# Altium schematic symbol library Analog Devices Data Converters Analog-to-Digital Converters.SchLib: 2404 symbols (part 15 of 213)
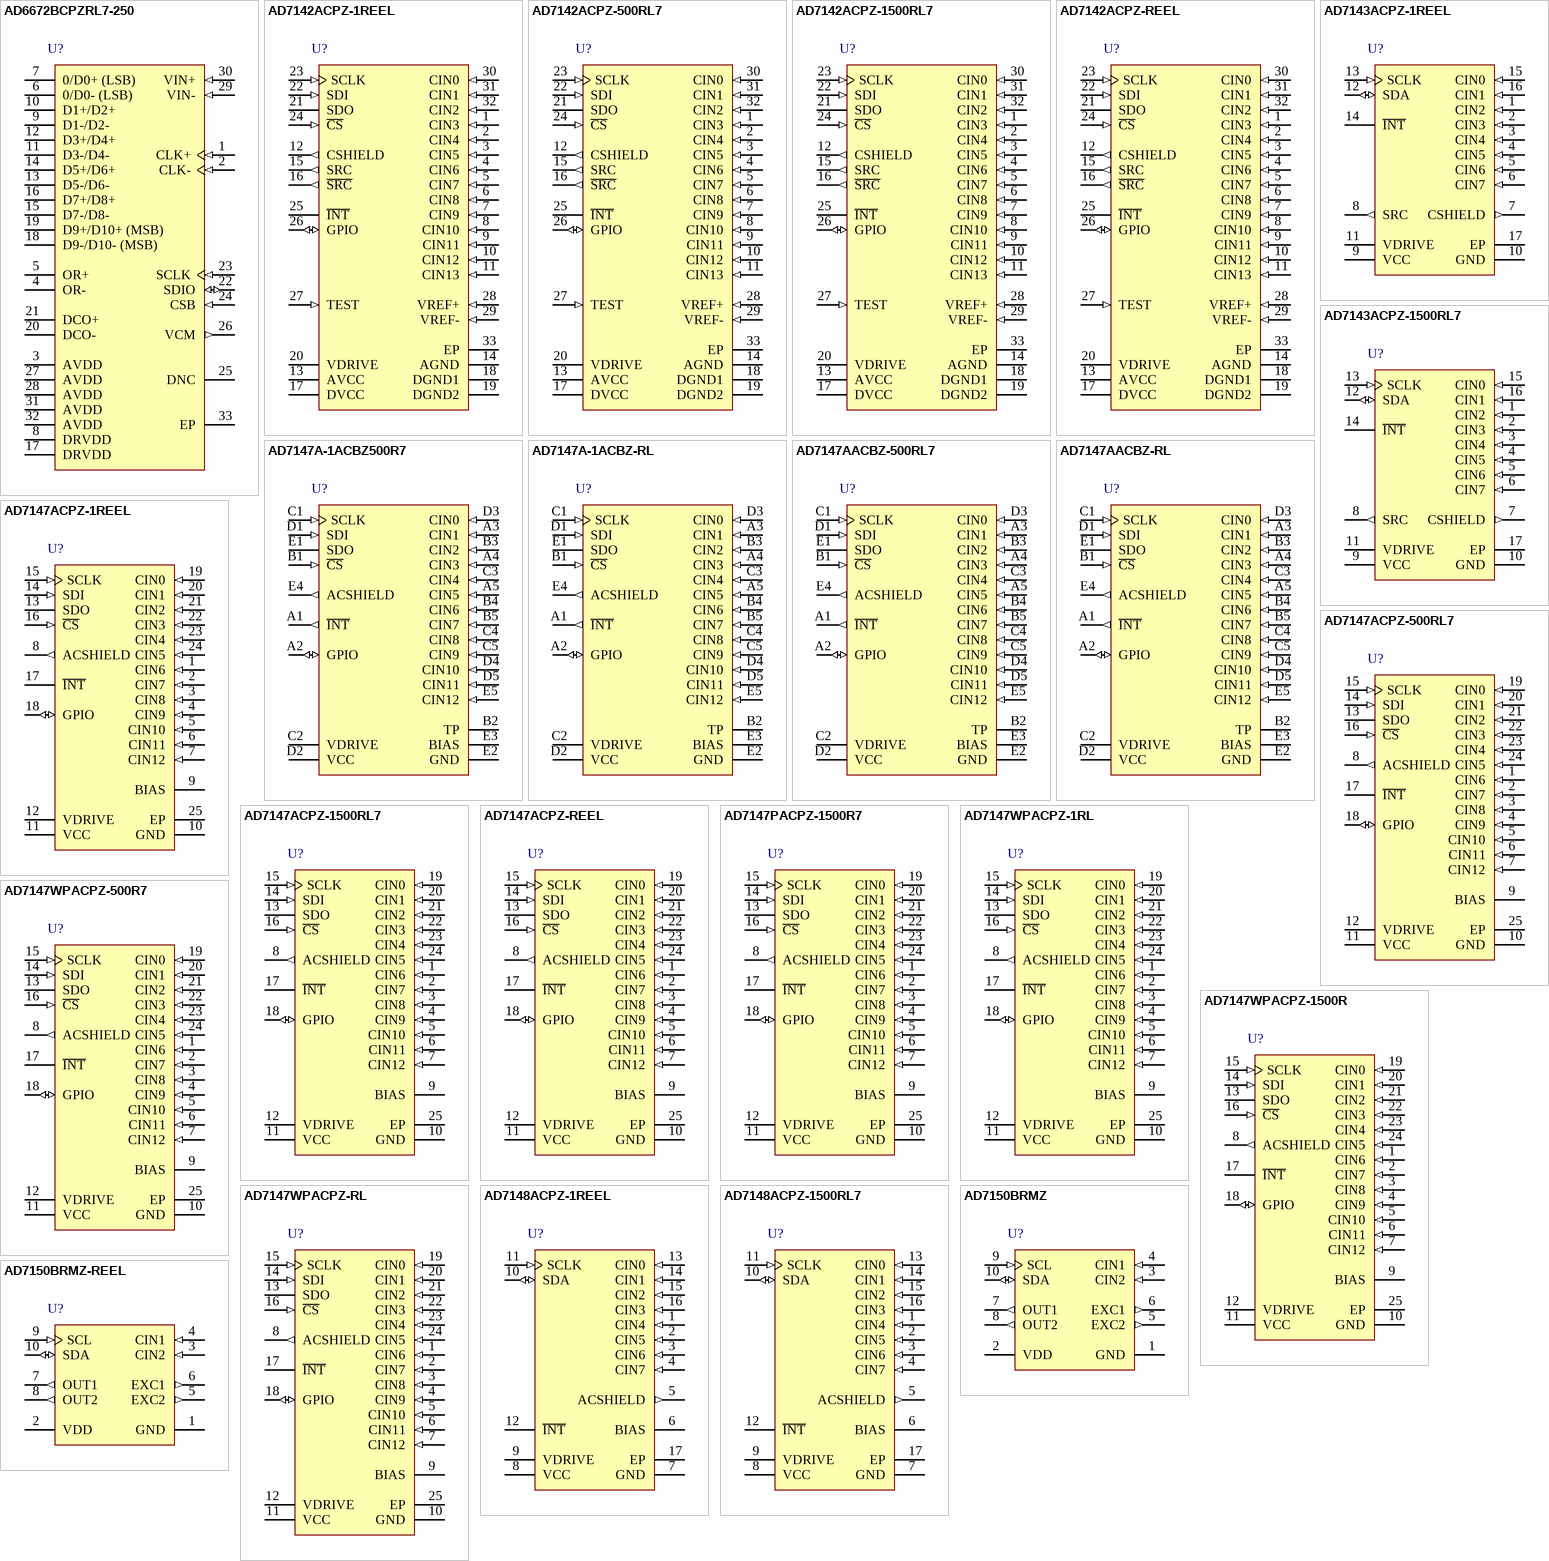
[diagram p170: symbols AD6672BCPZRL7-250 to AD7150BRMZ-REEL]

## AD7143ACPZ-1REEL
designator U?
Programmable Controller for Capacitance Touch Sensors with I2C/Ser 2-Wire, Serial Interface, 43.5SPS, -40 to +85 degC, CP-16-13, Pb-Free, Reel; Generic Part Number: AD7143; Manufacturer: Analog Devices; PartNumber: AD7143ACPZ-1REEL; Resolution (Bits): 16; Channels: 8; Throughput Rate (SPS): 43.5; DatasheetVersion: Rev.0; PackageVersion: 031006-A; PackageReference: CP-16-13; PackageDescription: 16-Lead Lead Frame Chip Scale Package [LFCSP_VQ] 4 x 4 mm Body, Very Thin Quad; Supplier 1: Digi-Key; Supplier Part Number 1: AD7143ACPZ-1REEL-ND; Supplier 2: Mouser; Supplier Part Number 2: 584-AD7143ACPZ-1R; Interface: I2C/Ser 2-Wire, Ser; RoHS: Y; Packing: Reel; Mounting Technology: Surface Mount; Code_JEDEC: MO-220-VGGC; ComponentLink1Description: Manufacturer URL; ComponentLink1URL: http://www.analog.com/en/index.html; ComponentLink2Description: Datasheet; ComponentLink2URL: http://www.analog.com/static/imported-files/data_sheets/AD7143.pdf; ComponentLink3Description: Package Specification; ComponentLink3URL: http://www.analog.com/static/imported-files/packages/PKG_PDF/LFCSP(CP)/CP-16/CP_16_13.pdf; ComponentLink4Description: Product URL; ComponentLink4URL: http://www.analog.com/en/analog-to-digital-converters/ad-converters/ad7143/products/product.html
footprint CP-16-13_N (QFN, 16-Leads, Body 4x4mm, Pitch 0.65mm, Thermal Pad 2.5x2.5mm, IPC Medium Density)
footprint CP-16-13_L (QFN, 16-Leads, Body 4x4mm, Pitch 0.65mm, Thermal Pad 2.5x2.5mm, IPC High Density)
footprint CP-16-13_M (QFN, 16-Leads, Body 4x4mm, Pitch 0.65mm, Thermal Pad 2.5x2.5mm, IPC Low Density)
pins: 1 CIN2 (in) "Capacitance Sensor Input.", 2 CIN3 (in) "Capacitance Sensor Input.", 3 CIN4 (in) "Capacitance Sensor Input.", 4 CIN5 (in) "Capacitance Sensor Input.", 5 CIN6 (in) "Capacitance Sensor Input.", 6 CIN7 (in) "Capacitance Sensor Input.", 7 CSHIELD (out) "CDC Shield Potential Output. Requires 10 nF capacitor to ground.", 8 SRC (out) "CDC Excitation Source Output.", 9 VCC (power) "CDC Supply Voltage.", 10 GND (power) "Ground Reference Point for All CDC Circuitry. Tie to ground plane.", 11 VDRIVE (power) "I2C Serial Interface Operating Voltage", 12 SDA (io) "I2C Serial Data Input/Output. SDA requires pull-up resistor", 13 SCLK (in) "Clock Input for Serial Interface. SCLK requires pull-up resistor.", 14 ~{INT} (oc) "General-Purpose Open-Drain Interrupt Output. Programmable polarity; requires pull-up resistor.", 15 CIN0 (in) "Capacitance Sensor Input.", 16 CIN1 (in) "Capacitance Sensor Input.", 17 EP (power) "Exposed pad"

## AD7143ACPZ-1500RL7
designator U?
Programmable Controller for Capacitance Touch Sensors with I2C/Ser 2-Wire, Serial Interface, 43.5SPS, -40 to +85 degC, CP-16-13, Pb-Free, Reel; Generic Part Number: AD7143; Manufacturer: Analog Devices; PartNumber: AD7143ACPZ-1500RL7; Resolution (Bits): 16; Channels: 8; Throughput Rate (SPS): 43.5; DatasheetVersion: Rev.0; PackageVersion: 031006-A; PackageReference: CP-16-13; PackageDescription: 16-Lead Lead Frame Chip Scale Package [LFCSP_VQ] 4 x 4 mm Body, Very Thin Quad; Supplier 1: Digi-Key; Supplier Part Number 1: AD7143ACPZ-1500RL7TR-ND; Supplier 2: Digi-Key; Supplier Part Number 2: AD7143ACPZ-1500RL7CT-ND; Supplier 3: Digi-Key; Supplier Part Number 3: AD7143ACPZ-1500RL7DKR-ND; Supplier 4: Mouser; Supplier Part Number 4: 584-AD7143ACPZ1500R7; Interface: I2C/Ser 2-Wire, Ser; RoHS: Y; Packing: Reel; Mounting Technology: Surface Mount; Code_JEDEC: MO-220-VGGC; ComponentLink1Description: Manufacturer URL; ComponentLink1URL: http://www.analog.com/en/index.html; ComponentLink2Description: Datasheet; ComponentLink2URL: http://www.analog.com/static/imported-files/data_sheets/AD7143.pdf; ComponentLink3Description: Package Specification; ComponentLink3URL: http://www.analog.com/static/imported-files/packages/PKG_PDF/LFCSP(CP)/CP-16/CP_16_13.pdf; ComponentLink4Description: Product URL; ComponentLink4URL: http://www.analog.com/en/analog-to-digital-converters/ad-converters/ad7143/products/product.html
footprint CP-16-13_N (QFN, 16-Leads, Body 4x4mm, Pitch 0.65mm, Thermal Pad 2.5x2.5mm, IPC Medium Density)
footprint CP-16-13_L (QFN, 16-Leads, Body 4x4mm, Pitch 0.65mm, Thermal Pad 2.5x2.5mm, IPC High Density)
footprint CP-16-13_M (QFN, 16-Leads, Body 4x4mm, Pitch 0.65mm, Thermal Pad 2.5x2.5mm, IPC Low Density)
pins: 1 CIN2 (in) "Capacitance Sensor Input.", 2 CIN3 (in) "Capacitance Sensor Input.", 3 CIN4 (in) "Capacitance Sensor Input.", 4 CIN5 (in) "Capacitance Sensor Input.", 5 CIN6 (in) "Capacitance Sensor Input.", 6 CIN7 (in) "Capacitance Sensor Input.", 7 CSHIELD (out) "CDC Shield Potential Output. Requires 10 nF capacitor to ground.", 8 SRC (out) "CDC Excitation Source Output.", 9 VCC (power) "CDC Supply Voltage.", 10 GND (power) "Ground Reference Point for All CDC Circuitry. Tie to ground plane.", 11 VDRIVE (power) "I2C Serial Interface Operating Voltage", 12 SDA (io) "I2C Serial Data Input/Output. SDA requires pull-up resistor", 13 SCLK (in) "Clock Input for Serial Interface. SCLK requires pull-up resistor.", 14 ~{INT} (oc) "General-Purpose Open-Drain Interrupt Output. Programmable polarity; requires pull-up resistor.", 15 CIN0 (in) "Capacitance Sensor Input.", 16 CIN1 (in) "Capacitance Sensor Input.", 17 EP (power) "Exposed pad"

## AD7147A-1ACBZ500R7
designator U?
13 Channel CapTouch Programmable Controller for Single-Electrode Capacitance Sensors, 111SPS, -40 to +85 degC, CB-25-3, Pb-Free, Reel; Generic Part Number: AD7147A; Manufacturer: Analog Devices; PartNumber: AD7147A-1ACBZ500R7; Resolution (Bits): 16; Channels: 13; Throughput Rate (SPS): 111; Interface: I2C/Ser 2-Wire, Ser, SPI; DatasheetVersion: Rev.B; PackageVersion: 081908-A; PackageReference: CB-25-3; PackageDescription: 25-Ball Wafer Level Chip Scale Package [WLCSP]; Supplier 1: Digi-Key; Supplier Part Number 1: AD7147A-1ACBZ500R7TR-ND; Supplier 2: Digi-Key; Supplier Part Number 2: AD7147A-1ACBZ500R7CT-ND; Supplier 3: Digi-Key; Supplier Part Number 3: AD7147A-1ACBZ500R7DKR-ND; Supplier 4: Newark; Supplier Part Number 4: 05R6583; Supplier 5: Mouser; Supplier Part Number 5: 584-A7147A1ACBZ500R7; RoHS: Y; Packing: Reel; Mounting Technology: Surface Mount; ComponentLink1Description: Manufacturer URL; ComponentLink1URL: http://www.analog.com/en/index.html; ComponentLink2Description: Datasheet; ComponentLink2URL: http://www.analog.com/static/imported-files/data_sheets/AD7147A.pdf; ComponentLink3Description: Package Specification; ComponentLink3URL: http://www.analog.com/static/imported-files/packages/PKG_PDF/WLCSP(CB)/CB_25_3.pdf; ComponentLink4Description: Product URL; ComponentLink4URL: http://www.analog.com/en/analog-to-digital-converters/ad-converters/ad7147a/products/product.html
footprint CB-25-3 (BGA, 25-Leads, Body 2.05x2.25mm, Pitch 0.4mm)
pins: A1 ~{INT} (out) "General-Purpose Open-Drain Interrupt Output. Programmable polarity; requires pull-up resistor.", A2 GPIO (io) "Programmable General-Purpose Input/Output.", A3 CIN1 (in) "Capacitance Sensor Input.", A4 CIN3 (in) "Capacitance Sensor Input.", A5 CIN5 (in) "Capacitance Sensor Input.", B1 ~{CS} (in) "SPI Chip Select Signal.", B2 TP (power) "Factory Test Point Only. Tie to ground.", B3 CIN2 (in) "Capacitance Sensor Input.", B4 CIN6 (in) "Capacitance Sensor Input.", B5 CIN7 (in) "Capacitance Sensor Input.", C1 SCLK (in) "Clock Input for Serial Interface.", C2 VDRIVE (power) "Serial Interface Operating Voltage Supply.", C3 CIN4 (in) "Capacitance Sensor Input.", C4 CIN8 (in) "Capacitance Sensor Input.", C5 CIN9 (in) "Capacitance Sensor Input.", D1 SDI (in) "SPI Serial Data Input.", D2 VCC (power) "Supply Voltage.", D3 CIN0 (in) "Capacitance Sensor Input.", D4 CIN10 (in) "Capacitance Sensor Input.", D5 CIN11 (in) "Capacitance Sensor Input.", E1 SDO (hiz) "SPI Serial Data Output.", E2 GND (power) "Ground Reference Point for All Circuitry.", E3 BIAS "Bias Node for Internal Circuitry. Requires 100 nF capacitor to ground.", E4 ACSHIELD (out) "CDC Active Shield Output. Connect to external shield or plane.", E5 CIN12 (in) "Capacitance Sensor Input."

## AD7147A-1ACBZ-RL
designator U?
13 Channel CapTouch Programmable Controller for Single-Electrode Capacitance Sensors, 111SPS, -40 to +85 degC, CB-25-3, Pb-Free, Reel; Generic Part Number: AD7147A; Manufacturer: Analog Devices; PartNumber: AD7147A-1ACBZ-RL; Resolution (Bits): 16; Channels: 13; Throughput Rate (SPS): 111; Interface: I2C/Ser 2-Wire, Ser, SPI; DatasheetVersion: Rev.B; PackageVersion: 081908-A; PackageReference: CB-25-3; PackageDescription: 25-Ball Wafer Level Chip Scale Package [WLCSP]; Supplier 1: Digi-Key; Supplier Part Number 1: AD7147A-1ACBZ-RL-ND; Supplier 2: Mouser; Supplier Part Number 2: 584-AD7147A-1ACBZ-R; RoHS: Y; Packing: Reel; Mounting Technology: Surface Mount; ComponentLink1Description: Manufacturer URL; ComponentLink1URL: http://www.analog.com/en/index.html; ComponentLink2Description: Datasheet; ComponentLink2URL: http://www.analog.com/static/imported-files/data_sheets/AD7147A.pdf; ComponentLink3Description: Package Specification; ComponentLink3URL: http://www.analog.com/static/imported-files/packages/PKG_PDF/WLCSP(CB)/CB_25_3.pdf; ComponentLink4Description: Product URL; ComponentLink4URL: http://www.analog.com/en/analog-to-digital-converters/ad-converters/ad7147a/products/product.html
footprint CB-25-3 (BGA, 25-Leads, Body 2.05x2.25mm, Pitch 0.4mm)
pins: A1 ~{INT} (out) "General-Purpose Open-Drain Interrupt Output. Programmable polarity; requires pull-up resistor.", A2 GPIO (io) "Programmable General-Purpose Input/Output.", A3 CIN1 (in) "Capacitance Sensor Input.", A4 CIN3 (in) "Capacitance Sensor Input.", A5 CIN5 (in) "Capacitance Sensor Input.", B1 ~{CS} (in) "SPI Chip Select Signal.", B2 TP (power) "Factory Test Point Only. Tie to ground.", B3 CIN2 (in) "Capacitance Sensor Input.", B4 CIN6 (in) "Capacitance Sensor Input.", B5 CIN7 (in) "Capacitance Sensor Input.", C1 SCLK (in) "Clock Input for Serial Interface.", C2 VDRIVE (power) "Serial Interface Operating Voltage Supply.", C3 CIN4 (in) "Capacitance Sensor Input.", C4 CIN8 (in) "Capacitance Sensor Input.", C5 CIN9 (in) "Capacitance Sensor Input.", D1 SDI (in) "SPI Serial Data Input.", D2 VCC (power) "Supply Voltage.", D3 CIN0 (in) "Capacitance Sensor Input.", D4 CIN10 (in) "Capacitance Sensor Input.", D5 CIN11 (in) "Capacitance Sensor Input.", E1 SDO (hiz) "SPI Serial Data Output.", E2 GND (power) "Ground Reference Point for All Circuitry.", E3 BIAS "Bias Node for Internal Circuitry. Requires 100 nF capacitor to ground.", E4 ACSHIELD (out) "CDC Active Shield Output. Connect to external shield or plane.", E5 CIN12 (in) "Capacitance Sensor Input."

## AD7147AACBZ-500RL7
designator U?
13 Channel CapTouch Programmable Controller for Single-Electrode Capacitance Sensors, 111SPS, -40 to +85 degC, CB-25-3, Pb-Free, Reel; Generic Part Number: AD7147A; Manufacturer: Analog Devices; PartNumber: AD7147AACBZ-500RL7; Resolution (Bits): 16; Channels: 13; Throughput Rate (SPS): 111; Interface: I2C/Ser 2-Wire, Ser, SPI; DatasheetVersion: Rev.B; PackageVersion: 081908-A; PackageReference: CB-25-3; PackageDescription: 25-Ball Wafer Level Chip Scale Package [WLCSP]; Supplier 1: Digi-Key; Supplier Part Number 1: AD7147AACBZ-500RL7TR-ND; Supplier 2: Digi-Key; Supplier Part Number 2: AD7147AACBZ-500RL7CT-ND; Supplier 3: Digi-Key; Supplier Part Number 3: AD7147AACBZ-500RL7DKR-ND; Supplier 4: Newark; Supplier Part Number 4: 05R6584; Supplier 5: Mouser; Supplier Part Number 5: 584-AD7147AACBZ500R7; RoHS: Y; Packing: Reel; Mounting Technology: Surface Mount; ComponentLink1Description: Manufacturer URL; ComponentLink1URL: http://www.analog.com/en/index.html; ComponentLink2Description: Datasheet; ComponentLink2URL: http://www.analog.com/static/imported-files/data_sheets/AD7147A.pdf; ComponentLink3Description: Package Specification; ComponentLink3URL: http://www.analog.com/static/imported-files/packages/PKG_PDF/WLCSP(CB)/CB_25_3.pdf; ComponentLink4Description: Product URL; ComponentLink4URL: http://www.analog.com/en/analog-to-digital-converters/ad-converters/ad7147a/products/product.html
footprint CB-25-3 (BGA, 25-Leads, Body 2.05x2.25mm, Pitch 0.4mm)
pins: A1 ~{INT} (out) "General-Purpose Open-Drain Interrupt Output. Programmable polarity; requires pull-up resistor.", A2 GPIO (io) "Programmable General-Purpose Input/Output.", A3 CIN1 (in) "Capacitance Sensor Input.", A4 CIN3 (in) "Capacitance Sensor Input.", A5 CIN5 (in) "Capacitance Sensor Input.", B1 ~{CS} (in) "SPI Chip Select Signal.", B2 TP (power) "Factory Test Point Only. Tie to ground.", B3 CIN2 (in) "Capacitance Sensor Input.", B4 CIN6 (in) "Capacitance Sensor Input.", B5 CIN7 (in) "Capacitance Sensor Input.", C1 SCLK (in) "Clock Input for Serial Interface.", C2 VDRIVE (power) "Serial Interface Operating Voltage Supply.", C3 CIN4 (in) "Capacitance Sensor Input.", C4 CIN8 (in) "Capacitance Sensor Input.", C5 CIN9 (in) "Capacitance Sensor Input.", D1 SDI (in) "SPI Serial Data Input.", D2 VCC (power) "Supply Voltage.", D3 CIN0 (in) "Capacitance Sensor Input.", D4 CIN10 (in) "Capacitance Sensor Input.", D5 CIN11 (in) "Capacitance Sensor Input.", E1 SDO (hiz) "SPI Serial Data Output.", E2 GND (power) "Ground Reference Point for All Circuitry.", E3 BIAS "Bias Node for Internal Circuitry. Requires 100 nF capacitor to ground.", E4 ACSHIELD (out) "CDC Active Shield Output. Connect to external shield or plane.", E5 CIN12 (in) "Capacitance Sensor Input."

## AD7147AACBZ-RL
designator U?
13 Channel CapTouch Programmable Controller for Single-Electrode Capacitance Sensors, 111SPS, -40 to +85 degC, CB-25-3, Pb-Free, Reel; Generic Part Number: AD7147A; Manufacturer: Analog Devices; PartNumber: AD7147AACBZ-RL; Resolution (Bits): 16; Channels: 13; Throughput Rate (SPS): 111; Interface: I2C/Ser 2-Wire, Ser, SPI; DatasheetVersion: Rev.B; PackageVersion: 081908-A; PackageReference: CB-25-3; PackageDescription: 25-Ball Wafer Level Chip Scale Package [WLCSP]; Supplier 1: Digi-Key; Supplier Part Number 1: AD7147AACBZ-RL-ND; Supplier 2: Newark; Supplier Part Number 2: 33R2708; Supplier 3: Mouser; Supplier Part Number 3: 584-AD7147AACBZ-R; RoHS: Y; Packing: Reel; Mounting Technology: Surface Mount; ComponentLink1Description: Manufacturer URL; ComponentLink1URL: http://www.analog.com/en/index.html; ComponentLink2Description: Datasheet; ComponentLink2URL: http://www.analog.com/static/imported-files/data_sheets/AD7147A.pdf; ComponentLink3Description: Package Specification; ComponentLink3URL: http://www.analog.com/static/imported-files/packages/PKG_PDF/WLCSP(CB)/CB_25_3.pdf; ComponentLink4Description: Product URL; ComponentLink4URL: http://www.analog.com/en/analog-to-digital-converters/ad-converters/ad7147a/products/product.html
footprint CB-25-3 (BGA, 25-Leads, Body 2.05x2.25mm, Pitch 0.4mm)
pins: A1 ~{INT} (out) "General-Purpose Open-Drain Interrupt Output. Programmable polarity; requires pull-up resistor.", A2 GPIO (io) "Programmable General-Purpose Input/Output.", A3 CIN1 (in) "Capacitance Sensor Input.", A4 CIN3 (in) "Capacitance Sensor Input.", A5 CIN5 (in) "Capacitance Sensor Input.", B1 ~{CS} (in) "SPI Chip Select Signal.", B2 TP (power) "Factory Test Point Only. Tie to ground.", B3 CIN2 (in) "Capacitance Sensor Input.", B4 CIN6 (in) "Capacitance Sensor Input.", B5 CIN7 (in) "Capacitance Sensor Input.", C1 SCLK (in) "Clock Input for Serial Interface.", C2 VDRIVE (power) "Serial Interface Operating Voltage Supply.", C3 CIN4 (in) "Capacitance Sensor Input.", C4 CIN8 (in) "Capacitance Sensor Input.", C5 CIN9 (in) "Capacitance Sensor Input.", D1 SDI (in) "SPI Serial Data Input.", D2 VCC (power) "Supply Voltage.", D3 CIN0 (in) "Capacitance Sensor Input.", D4 CIN10 (in) "Capacitance Sensor Input.", D5 CIN11 (in) "Capacitance Sensor Input.", E1 SDO (hiz) "SPI Serial Data Output.", E2 GND (power) "Ground Reference Point for All Circuitry.", E3 BIAS "Bias Node for Internal Circuitry. Requires 100 nF capacitor to ground.", E4 ACSHIELD (out) "CDC Active Shield Output. Connect to external shield or plane.", E5 CIN12 (in) "Capacitance Sensor Input."

## AD7147ACPZ-1REEL
designator U?
13 Channel CapTouch Programmable Controller for Single-Electrode Capacitance Sensors, 111SPS, -40 to +85 degC, CP-24-3, Pb-Free, Reel; Generic Part Number: AD7147; Manufacturer: Analog Devices; PartNumber: AD7147ACPZ-1REEL; Resolution (Bits): 16; Channels: 13; Throughput Rate (SPS): 111; Interface: I2C/Ser 2-Wire, Ser, SPI; Automotive Qualified: Yes; DatasheetVersion: Rev.D; PackageVersion: Jan-2005; PackageReference: CP-24-3; PackageDescription: 24-Lead Lead Frame Chip Scale Package [LFCSP_VQ] 4 x 4 mm Body, Very Thin Quad; Supplier 1: Digi-Key; Supplier Part Number 1: AD7147ACPZ-1REEL-ND; Supplier 2: Newark; Supplier Part Number 2: 61M4033; Supplier 3: Mouser; Supplier Part Number 3: 584-AD7147ACPZ-1R; RoHS: Y; Packing: Reel; Mounting Technology: Surface Mount; Code_JEDEC: MO-220-VGGD-8; ComponentLink1Description: Manufacturer URL; ComponentLink1URL: http://www.analog.com/en/index.html; ComponentLink2Description: Datasheet; ComponentLink2URL: http://www.analog.com/static/imported-files/data_sheets/AD7147.pdf; ComponentLink3Description: Package Specification; ComponentLink3URL: http://www.analog.com/static/imported-files/packages/56702234806764CP_24_3.pdf; ComponentLink4Description: Product URL; ComponentLink4URL: http://www.analog.com/en/analog-to-digital-converters/ad-converters/ad7147/products/product.html
footprint CP-24-3_N (QFN, 24-Leads, Body 4x4mm, Pitch 0.5mm, Thermal Pad 2.5x2.5mm, IPC Medium Density)
footprint CP-24-3_L (QFN, 24-Leads, Body 4x4mm, Pitch 0.5mm, Thermal Pad 2.5x2.5mm, IPC High Density)
footprint CP-24-3_M (QFN, 24-Leads, Body 4x4mm, Pitch 0.5mm, Thermal Pad 2.5x2.5mm, IPC Low Density)
pins: 1 CIN6 (in) "Capacitance Sensor Input.", 2 CIN7 (in) "Capacitance Sensor Input.", 3 CIN8 (in) "Capacitance Sensor Input.", 4 CIN9 (in) "Capacitance Sensor Input.", 5 CIN10 (in) "Capacitance Sensor Input.", 6 CIN11 (in) "Capacitance Sensor Input.", 7 CIN12 (in) "Capacitance Sensor Input.", 8 ACSHIELD (out) "CDC Active Shield Output. Connect to external shield or plane.", 9 BIAS "Bias Node for Internal Circuitry. Requires 100 nF capacitor to ground.", 10 GND (power) "Ground Reference Point for All Circuitry.", 11 VCC (power) "Supply Voltage.", 12 VDRIVE (power) "Serial Interface Operating Voltage Supply.", 13 SDO (hiz) "SPI Serial Data Output.", 14 SDI (in) "SPI Serial Data Input.", 15 SCLK (in) "Clock Input for Serial Interface.", 16 ~{CS} (in) "SPI Chip Select Signal.", 17 ~{INT} (oc) "General-Purpose Open-Drain Interrupt Output. Programmable polarity; requires pull-up resistor.", 18 GPIO (io) "Programmable GPIO.", 19 CIN0 (in) "Capacitance Sensor Input.", 20 CIN1 (in) "Capacitance Sensor Input.", 21 CIN2 (in) "Capacitance Sensor Input.", 22 CIN3 (in) "Capacitance Sensor Input.", 23 CIN4 (in) "Capacitance Sensor Input.", 24 CIN5 (in) "Capacitance Sensor Input.", 25 EP (power) "Capacitance Sensor Input."

## AD7147ACPZ-500RL7
designator U?
13 Channel CapTouch Programmable Controller for Single-Electrode Capacitance Sensors, 111SPS, -40 to +85 degC, CP-24-3, Pb-Free, Reel; Generic Part Number: AD7147; Manufacturer: Analog Devices; PartNumber: AD7147ACPZ-500RL7; Resolution (Bits): 16; Channels: 13; Throughput Rate (SPS): 111; Interface: I2C/Ser 2-Wire, Ser, SPI; Automotive Qualified: Yes; DatasheetVersion: Rev.D; PackageVersion: Jan-2005; PackageReference: CP-24-3; PackageDescription: 24-Lead Lead Frame Chip Scale Package [LFCSP_VQ] 4 x 4 mm Body, Very Thin Quad; Supplier 1: Digi-Key; Supplier Part Number 1: AD7147ACPZ-500RL7TR-ND; Supplier 2: Digi-Key; Supplier Part Number 2: AD7147ACPZ-500RL7CT-ND; Supplier 3: Digi-Key; Supplier Part Number 3: AD7147ACPZ-500RL7DKR-ND; Supplier 4: Farnell; Supplier Part Number 4: 1699634; Supplier 5: Newark; Supplier Part Number 5: 61M4035; Supplier 6: Mouser; Supplier Part Number 6: 584-AD7147ACPZ-500R7; RoHS: Y; Packing: Reel; Mounting Technology: Surface Mount; Code_JEDEC: MO-220-VGGD-8; ComponentLink1Description: Manufacturer URL; ComponentLink1URL: http://www.analog.com/en/index.html; ComponentLink2Description: Datasheet; ComponentLink2URL: http://www.analog.com/static/imported-files/data_sheets/AD7147.pdf; ComponentLink3Description: Package Specification; ComponentLink3URL: http://www.analog.com/static/imported-files/packages/56702234806764CP_24_3.pdf; ComponentLink4Description: Product URL; ComponentLink4URL: http://www.analog.com/en/analog-to-digital-converters/ad-converters/ad7147/products/product.html
footprint CP-24-3_N (QFN, 24-Leads, Body 4x4mm, Pitch 0.5mm, Thermal Pad 2.5x2.5mm, IPC Medium Density)
footprint CP-24-3_L (QFN, 24-Leads, Body 4x4mm, Pitch 0.5mm, Thermal Pad 2.5x2.5mm, IPC High Density)
footprint CP-24-3_M (QFN, 24-Leads, Body 4x4mm, Pitch 0.5mm, Thermal Pad 2.5x2.5mm, IPC Low Density)
pins: 1 CIN6 (in) "Capacitance Sensor Input.", 2 CIN7 (in) "Capacitance Sensor Input.", 3 CIN8 (in) "Capacitance Sensor Input.", 4 CIN9 (in) "Capacitance Sensor Input.", 5 CIN10 (in) "Capacitance Sensor Input.", 6 CIN11 (in) "Capacitance Sensor Input.", 7 CIN12 (in) "Capacitance Sensor Input.", 8 ACSHIELD (out) "CDC Active Shield Output. Connect to external shield or plane.", 9 BIAS "Bias Node for Internal Circuitry. Requires 100 nF capacitor to ground.", 10 GND (power) "Ground Reference Point for All Circuitry.", 11 VCC (power) "Supply Voltage.", 12 VDRIVE (power) "Serial Interface Operating Voltage Supply.", 13 SDO (hiz) "SPI Serial Data Output.", 14 SDI (in) "SPI Serial Data Input.", 15 SCLK (in) "Clock Input for Serial Interface.", 16 ~{CS} (in) "SPI Chip Select Signal.", 17 ~{INT} (oc) "General-Purpose Open-Drain Interrupt Output. Programmable polarity; requires pull-up resistor.", 18 GPIO (io) "Programmable GPIO.", 19 CIN0 (in) "Capacitance Sensor Input.", 20 CIN1 (in) "Capacitance Sensor Input.", 21 CIN2 (in) "Capacitance Sensor Input.", 22 CIN3 (in) "Capacitance Sensor Input.", 23 CIN4 (in) "Capacitance Sensor Input.", 24 CIN5 (in) "Capacitance Sensor Input.", 25 EP (power) "Capacitance Sensor Input."

## AD7147ACPZ-1500RL7
designator U?
13 Channel CapTouch Programmable Controller for Single-Electrode Capacitance Sensors, 111SPS, -40 to +85 degC, CP-24-3, Pb-Free, Reel; Generic Part Number: AD7147; Manufacturer: Analog Devices; PartNumber: AD7147ACPZ-1500RL7; Resolution (Bits): 16; Channels: 13; Throughput Rate (SPS): 111; Interface: I2C/Ser 2-Wire, Ser, SPI; Automotive Qualified: Yes; DatasheetVersion: Rev.D; PackageVersion: Jan-2005; PackageReference: CP-24-3; PackageDescription: 24-Lead Lead Frame Chip Scale Package [LFCSP_VQ] 4 x 4 mm Body, Very Thin Quad; Supplier 1: Digi-Key; Supplier Part Number 1: AD7147ACPZ-1500RL7TR-ND; Supplier 2: Digi-Key; Supplier Part Number 2: AD7147ACPZ-1500RL7CT-ND; Supplier 3: Digi-Key; Supplier Part Number 3: AD7147ACPZ-1500RL7DKR-ND; Supplier 4: Farnell; Supplier Part Number 4: 1838856; Supplier 5: Newark; Supplier Part Number 5: 61M4034; Supplier 6: Mouser; Supplier Part Number 6: 584-AD7147ACPZ1500R7; RoHS: Y; Packing: Reel; Mounting Technology: Surface Mount; Code_JEDEC: MO-220-VGGD-8; ComponentLink1Description: Manufacturer URL; ComponentLink1URL: http://www.analog.com/en/index.html; ComponentLink2Description: Datasheet; ComponentLink2URL: http://www.analog.com/static/imported-files/data_sheets/AD7147.pdf; ComponentLink3Description: Package Specification; ComponentLink3URL: http://www.analog.com/static/imported-files/packages/56702234806764CP_24_3.pdf; ComponentLink4Description: Product URL; ComponentLink4URL: http://www.analog.com/en/analog-to-digital-converters/ad-converters/ad7147/products/product.html
footprint CP-24-3_N (QFN, 24-Leads, Body 4x4mm, Pitch 0.5mm, Thermal Pad 2.5x2.5mm, IPC Medium Density)
footprint CP-24-3_L (QFN, 24-Leads, Body 4x4mm, Pitch 0.5mm, Thermal Pad 2.5x2.5mm, IPC High Density)
footprint CP-24-3_M (QFN, 24-Leads, Body 4x4mm, Pitch 0.5mm, Thermal Pad 2.5x2.5mm, IPC Low Density)
pins: 1 CIN6 (in) "Capacitance Sensor Input.", 2 CIN7 (in) "Capacitance Sensor Input.", 3 CIN8 (in) "Capacitance Sensor Input.", 4 CIN9 (in) "Capacitance Sensor Input.", 5 CIN10 (in) "Capacitance Sensor Input.", 6 CIN11 (in) "Capacitance Sensor Input.", 7 CIN12 (in) "Capacitance Sensor Input.", 8 ACSHIELD (out) "CDC Active Shield Output. Connect to external shield or plane.", 9 BIAS "Bias Node for Internal Circuitry. Requires 100 nF capacitor to ground.", 10 GND (power) "Ground Reference Point for All Circuitry.", 11 VCC (power) "Supply Voltage.", 12 VDRIVE (power) "Serial Interface Operating Voltage Supply.", 13 SDO (hiz) "SPI Serial Data Output.", 14 SDI (in) "SPI Serial Data Input.", 15 SCLK (in) "Clock Input for Serial Interface.", 16 ~{CS} (in) "SPI Chip Select Signal.", 17 ~{INT} (oc) "General-Purpose Open-Drain Interrupt Output. Programmable polarity; requires pull-up resistor.", 18 GPIO (io) "Programmable GPIO.", 19 CIN0 (in) "Capacitance Sensor Input.", 20 CIN1 (in) "Capacitance Sensor Input.", 21 CIN2 (in) "Capacitance Sensor Input.", 22 CIN3 (in) "Capacitance Sensor Input.", 23 CIN4 (in) "Capacitance Sensor Input.", 24 CIN5 (in) "Capacitance Sensor Input.", 25 EP (power) "Capacitance Sensor Input."

## AD7147ACPZ-REEL
designator U?
13 Channel CapTouch Programmable Controller for Single-Electrode Capacitance Sensors, 111SPS, -40 to +85 degC, CP-24-3, Pb-Free, Reel; Generic Part Number: AD7147; Manufacturer: Analog Devices; PartNumber: AD7147ACPZ-REEL; Resolution (Bits): 16; Channels: 13; Throughput Rate (SPS): 111; Interface: I2C/Ser 2-Wire, Ser, SPI; Automotive Qualified: Yes; DatasheetVersion: Rev.D; PackageVersion: Jan-2005; PackageReference: CP-24-3; PackageDescription: 24-Lead Lead Frame Chip Scale Package [LFCSP_VQ] 4 x 4 mm Body, Very Thin Quad; Supplier 1: Digi-Key; Supplier Part Number 1: AD7147ACPZ-REEL-ND; Supplier 2: Newark; Supplier Part Number 2: 61M4032; Supplier 3: Mouser; Supplier Part Number 3: 584-AD7147ACPZ-R; RoHS: Y; Packing: Reel; Mounting Technology: Surface Mount; Code_JEDEC: MO-220-VGGD-8; ComponentLink1Description: Manufacturer URL; ComponentLink1URL: http://www.analog.com/en/index.html; ComponentLink2Description: Datasheet; ComponentLink2URL: http://www.analog.com/static/imported-files/data_sheets/AD7147.pdf; ComponentLink3Description: Package Specification; ComponentLink3URL: http://www.analog.com/static/imported-files/packages/56702234806764CP_24_3.pdf; ComponentLink4Description: Product URL; ComponentLink4URL: http://www.analog.com/en/analog-to-digital-converters/ad-converters/ad7147/products/product.html
footprint CP-24-3_N (QFN, 24-Leads, Body 4x4mm, Pitch 0.5mm, Thermal Pad 2.5x2.5mm, IPC Medium Density)
footprint CP-24-3_L (QFN, 24-Leads, Body 4x4mm, Pitch 0.5mm, Thermal Pad 2.5x2.5mm, IPC High Density)
footprint CP-24-3_M (QFN, 24-Leads, Body 4x4mm, Pitch 0.5mm, Thermal Pad 2.5x2.5mm, IPC Low Density)
pins: 1 CIN6 (in) "Capacitance Sensor Input.", 2 CIN7 (in) "Capacitance Sensor Input.", 3 CIN8 (in) "Capacitance Sensor Input.", 4 CIN9 (in) "Capacitance Sensor Input.", 5 CIN10 (in) "Capacitance Sensor Input.", 6 CIN11 (in) "Capacitance Sensor Input.", 7 CIN12 (in) "Capacitance Sensor Input.", 8 ACSHIELD (out) "CDC Active Shield Output. Connect to external shield or plane.", 9 BIAS "Bias Node for Internal Circuitry. Requires 100 nF capacitor to ground.", 10 GND (power) "Ground Reference Point for All Circuitry.", 11 VCC (power) "Supply Voltage.", 12 VDRIVE (power) "Serial Interface Operating Voltage Supply.", 13 SDO (hiz) "SPI Serial Data Output.", 14 SDI (in) "SPI Serial Data Input.", 15 SCLK (in) "Clock Input for Serial Interface.", 16 ~{CS} (in) "SPI Chip Select Signal.", 17 ~{INT} (oc) "General-Purpose Open-Drain Interrupt Output. Programmable polarity; requires pull-up resistor.", 18 GPIO (io) "Programmable GPIO.", 19 CIN0 (in) "Capacitance Sensor Input.", 20 CIN1 (in) "Capacitance Sensor Input.", 21 CIN2 (in) "Capacitance Sensor Input.", 22 CIN3 (in) "Capacitance Sensor Input.", 23 CIN4 (in) "Capacitance Sensor Input.", 24 CIN5 (in) "Capacitance Sensor Input.", 25 EP (power) "Capacitance Sensor Input."

## AD7147PACPZ-1500R7
designator U?
13 Channel CapTouch Programmable Controller for Single-Electrode Capacitance Sensors, 111SPS, -40 to +85 degC, CP-24-3, Pb-Free, Reel; Generic Part Number: AD7147; Manufacturer: Analog Devices; PartNumber: AD7147PACPZ-1500R7; Resolution (Bits): 16; Channels: 13; Throughput Rate (SPS): 111; Interface: I2C/Ser 2-Wire, Ser, SPI; Automotive Qualified: Yes; DatasheetVersion: Rev.D; PackageVersion: Jan-2005; PackageReference: CP-24-3; PackageDescription: 24-Lead Lead Frame Chip Scale Package [LFCSP_VQ] 4 x 4 mm Body, Very Thin Quad; Supplier 1: Digi-Key; Supplier Part Number 1: AD7147PACPZ-1500R7TR-ND; Supplier 2: Digi-Key; Supplier Part Number 2: AD7147PACPZ-1500R7CT-ND; Supplier 3: Digi-Key; Supplier Part Number 3: AD7147PACPZ-1500R7DKR-ND; Supplier 4: Mouser; Supplier Part Number 4: 584-A7147PACPZ1500R7; RoHS: Y; Packing: Reel; Mounting Technology: Surface Mount; Code_JEDEC: MO-220-VGGD-8; ComponentLink1Description: Manufacturer URL; ComponentLink1URL: http://www.analog.com/en/index.html; ComponentLink2Description: Datasheet; ComponentLink2URL: http://www.analog.com/static/imported-files/data_sheets/AD7147.pdf; ComponentLink3Description: Package Specification; ComponentLink3URL: http://www.analog.com/static/imported-files/packages/56702234806764CP_24_3.pdf; ComponentLink4Description: Product URL; ComponentLink4URL: http://www.analog.com/en/analog-to-digital-converters/ad-converters/ad7147/products/product.html
footprint CP-24-3_N (QFN, 24-Leads, Body 4x4mm, Pitch 0.5mm, Thermal Pad 2.5x2.5mm, IPC Medium Density)
footprint CP-24-3_L (QFN, 24-Leads, Body 4x4mm, Pitch 0.5mm, Thermal Pad 2.5x2.5mm, IPC High Density)
footprint CP-24-3_M (QFN, 24-Leads, Body 4x4mm, Pitch 0.5mm, Thermal Pad 2.5x2.5mm, IPC Low Density)
pins: 1 CIN6 (in) "Capacitance Sensor Input.", 2 CIN7 (in) "Capacitance Sensor Input.", 3 CIN8 (in) "Capacitance Sensor Input.", 4 CIN9 (in) "Capacitance Sensor Input.", 5 CIN10 (in) "Capacitance Sensor Input.", 6 CIN11 (in) "Capacitance Sensor Input.", 7 CIN12 (in) "Capacitance Sensor Input.", 8 ACSHIELD (out) "CDC Active Shield Output. Connect to external shield or plane.", 9 BIAS "Bias Node for Internal Circuitry. Requires 100 nF capacitor to ground.", 10 GND (power) "Ground Reference Point for All Circuitry.", 11 VCC (power) "Supply Voltage.", 12 VDRIVE (power) "Serial Interface Operating Voltage Supply.", 13 SDO (hiz) "SPI Serial Data Output.", 14 SDI (in) "SPI Serial Data Input.", 15 SCLK (in) "Clock Input for Serial Interface.", 16 ~{CS} (in) "SPI Chip Select Signal.", 17 ~{INT} (oc) "General-Purpose Open-Drain Interrupt Output. Programmable polarity; requires pull-up resistor.", 18 GPIO (io) "Programmable GPIO.", 19 CIN0 (in) "Capacitance Sensor Input.", 20 CIN1 (in) "Capacitance Sensor Input.", 21 CIN2 (in) "Capacitance Sensor Input.", 22 CIN3 (in) "Capacitance Sensor Input.", 23 CIN4 (in) "Capacitance Sensor Input.", 24 CIN5 (in) "Capacitance Sensor Input.", 25 EP (power) "Capacitance Sensor Input."

## AD7147WPACPZ-1RL
designator U?
13 Channel CapTouch Programmable Controller for Single-Electrode Capacitance Sensors, 111SPS, -40 to +85 degC, CP-24-3, Pb-Free, Reel; Generic Part Number: AD7147; Manufacturer: Analog Devices; PartNumber: AD7147WPACPZ-1RL; Resolution (Bits): 16; Channels: 13; Throughput Rate (SPS): 111; Interface: I2C/Ser 2-Wire, Ser, SPI; Automotive Qualified: Yes; DatasheetVersion: Rev.D; PackageVersion: Jan-2005; PackageReference: CP-24-3; PackageDescription: 24-Lead Lead Frame Chip Scale Package [LFCSP_VQ] 4 x 4 mm Body, Very Thin Quad; Supplier 1: Digi-Key; Supplier Part Number 1: AD7147WPACPZ-1RL-ND; Supplier 2: Mouser; Supplier Part Number 2: 584-AD7147WPACPZ-1R; RoHS: Y; Packing: Reel; Mounting Technology: Surface Mount; Code_JEDEC: MO-220-VGGD-8; ComponentLink1Description: Manufacturer URL; ComponentLink1URL: http://www.analog.com/en/index.html; ComponentLink2Description: Datasheet; ComponentLink2URL: http://www.analog.com/static/imported-files/data_sheets/AD7147.pdf; ComponentLink3Description: Package Specification; ComponentLink3URL: http://www.analog.com/static/imported-files/packages/56702234806764CP_24_3.pdf; ComponentLink4Description: Product URL; ComponentLink4URL: http://www.analog.com/en/analog-to-digital-converters/ad-converters/ad7147/products/product.html
footprint CP-24-3_N (QFN, 24-Leads, Body 4x4mm, Pitch 0.5mm, Thermal Pad 2.5x2.5mm, IPC Medium Density)
footprint CP-24-3_L (QFN, 24-Leads, Body 4x4mm, Pitch 0.5mm, Thermal Pad 2.5x2.5mm, IPC High Density)
footprint CP-24-3_M (QFN, 24-Leads, Body 4x4mm, Pitch 0.5mm, Thermal Pad 2.5x2.5mm, IPC Low Density)
pins: 1 CIN6 (in) "Capacitance Sensor Input.", 2 CIN7 (in) "Capacitance Sensor Input.", 3 CIN8 (in) "Capacitance Sensor Input.", 4 CIN9 (in) "Capacitance Sensor Input.", 5 CIN10 (in) "Capacitance Sensor Input.", 6 CIN11 (in) "Capacitance Sensor Input.", 7 CIN12 (in) "Capacitance Sensor Input.", 8 ACSHIELD (out) "CDC Active Shield Output. Connect to external shield or plane.", 9 BIAS "Bias Node for Internal Circuitry. Requires 100 nF capacitor to ground.", 10 GND (power) "Ground Reference Point for All Circuitry.", 11 VCC (power) "Supply Voltage.", 12 VDRIVE (power) "Serial Interface Operating Voltage Supply.", 13 SDO (hiz) "SPI Serial Data Output.", 14 SDI (in) "SPI Serial Data Input.", 15 SCLK (in) "Clock Input for Serial Interface.", 16 ~{CS} (in) "SPI Chip Select Signal.", 17 ~{INT} (oc) "General-Purpose Open-Drain Interrupt Output. Programmable polarity; requires pull-up resistor.", 18 GPIO (io) "Programmable GPIO.", 19 CIN0 (in) "Capacitance Sensor Input.", 20 CIN1 (in) "Capacitance Sensor Input.", 21 CIN2 (in) "Capacitance Sensor Input.", 22 CIN3 (in) "Capacitance Sensor Input.", 23 CIN4 (in) "Capacitance Sensor Input.", 24 CIN5 (in) "Capacitance Sensor Input.", 25 EP (power) "Capacitance Sensor Input."

## AD7147WPACPZ-500R7
designator U?
13 Channel CapTouch Programmable Controller for Single-Electrode Capacitance Sensors, 111SPS, -40 to +85 degC, CP-24-3, Pb-Free, Reel; Generic Part Number: AD7147; Manufacturer: Analog Devices; PartNumber: AD7147WPACPZ-500R7; Resolution (Bits): 16; Channels: 13; Throughput Rate (SPS): 111; Interface: I2C/Ser 2-Wire, Ser, SPI; Automotive Qualified: Yes; DatasheetVersion: Rev.D; PackageVersion: Jan-2005; PackageReference: CP-24-3; PackageDescription: 24-Lead Lead Frame Chip Scale Package [LFCSP_VQ] 4 x 4 mm Body, Very Thin Quad; Supplier 1: Digi-Key; Supplier Part Number 1: AD7147WPACPZ-500R7-ND; Supplier 2: Mouser; Supplier Part Number 2: 584-A7147WPACPZ500R7; RoHS: Y; Packing: Reel; Mounting Technology: Surface Mount; Code_JEDEC: MO-220-VGGD-8; ComponentLink1Description: Manufacturer URL; ComponentLink1URL: http://www.analog.com/en/index.html; ComponentLink2Description: Datasheet; ComponentLink2URL: http://www.analog.com/static/imported-files/data_sheets/AD7147.pdf; ComponentLink3Description: Package Specification; ComponentLink3URL: http://www.analog.com/static/imported-files/packages/56702234806764CP_24_3.pdf; ComponentLink4Description: Product URL; ComponentLink4URL: http://www.analog.com/en/analog-to-digital-converters/ad-converters/ad7147/products/product.html
footprint CP-24-3_N (QFN, 24-Leads, Body 4x4mm, Pitch 0.5mm, Thermal Pad 2.5x2.5mm, IPC Medium Density)
footprint CP-24-3_L (QFN, 24-Leads, Body 4x4mm, Pitch 0.5mm, Thermal Pad 2.5x2.5mm, IPC High Density)
footprint CP-24-3_M (QFN, 24-Leads, Body 4x4mm, Pitch 0.5mm, Thermal Pad 2.5x2.5mm, IPC Low Density)
pins: 1 CIN6 (in) "Capacitance Sensor Input.", 2 CIN7 (in) "Capacitance Sensor Input.", 3 CIN8 (in) "Capacitance Sensor Input.", 4 CIN9 (in) "Capacitance Sensor Input.", 5 CIN10 (in) "Capacitance Sensor Input.", 6 CIN11 (in) "Capacitance Sensor Input.", 7 CIN12 (in) "Capacitance Sensor Input.", 8 ACSHIELD (out) "CDC Active Shield Output. Connect to external shield or plane.", 9 BIAS "Bias Node for Internal Circuitry. Requires 100 nF capacitor to ground.", 10 GND (power) "Ground Reference Point for All Circuitry.", 11 VCC (power) "Supply Voltage.", 12 VDRIVE (power) "Serial Interface Operating Voltage Supply.", 13 SDO (hiz) "SPI Serial Data Output.", 14 SDI (in) "SPI Serial Data Input.", 15 SCLK (in) "Clock Input for Serial Interface.", 16 ~{CS} (in) "SPI Chip Select Signal.", 17 ~{INT} (oc) "General-Purpose Open-Drain Interrupt Output. Programmable polarity; requires pull-up resistor.", 18 GPIO (io) "Programmable GPIO.", 19 CIN0 (in) "Capacitance Sensor Input.", 20 CIN1 (in) "Capacitance Sensor Input.", 21 CIN2 (in) "Capacitance Sensor Input.", 22 CIN3 (in) "Capacitance Sensor Input.", 23 CIN4 (in) "Capacitance Sensor Input.", 24 CIN5 (in) "Capacitance Sensor Input.", 25 EP (power) "Capacitance Sensor Input."

## AD7147WPACPZ-1500R
designator U?
13 Channel CapTouch Programmable Controller for Single-Electrode Capacitance Sensors, 111SPS, -40 to +85 degC, CP-24-3, Pb-Free, Reel; Generic Part Number: AD7147; Manufacturer: Analog Devices; PartNumber: AD7147WPACPZ-1500R; Resolution (Bits): 16; Channels: 13; Throughput Rate (SPS): 111; Interface: I2C/Ser 2-Wire, Ser, SPI; Automotive Qualified: Yes; DatasheetVersion: Rev.D; PackageVersion: Jan-2005; PackageReference: CP-24-3; PackageDescription: 24-Lead Lead Frame Chip Scale Package [LFCSP_VQ] 4 x 4 mm Body, Very Thin Quad; Supplier 1: Digi-Key; Supplier Part Number 1: AD7147WPACPZ-1500R-ND; Supplier 2: Mouser; Supplier Part Number 2: 584-A7147WPACPZ1500R; RoHS: Y; Packing: Reel; Mounting Technology: Surface Mount; Code_JEDEC: MO-220-VGGD-8; ComponentLink1Description: Manufacturer URL; ComponentLink1URL: http://www.analog.com/en/index.html; ComponentLink2Description: Datasheet; ComponentLink2URL: http://www.analog.com/static/imported-files/data_sheets/AD7147.pdf; ComponentLink3Description: Package Specification; ComponentLink3URL: http://www.analog.com/static/imported-files/packages/56702234806764CP_24_3.pdf; ComponentLink4Description: Product URL; ComponentLink4URL: http://www.analog.com/en/analog-to-digital-converters/ad-converters/ad7147/products/product.html
footprint CP-24-3_N (QFN, 24-Leads, Body 4x4mm, Pitch 0.5mm, Thermal Pad 2.5x2.5mm, IPC Medium Density)
footprint CP-24-3_L (QFN, 24-Leads, Body 4x4mm, Pitch 0.5mm, Thermal Pad 2.5x2.5mm, IPC High Density)
footprint CP-24-3_M (QFN, 24-Leads, Body 4x4mm, Pitch 0.5mm, Thermal Pad 2.5x2.5mm, IPC Low Density)
pins: 1 CIN6 (in) "Capacitance Sensor Input.", 2 CIN7 (in) "Capacitance Sensor Input.", 3 CIN8 (in) "Capacitance Sensor Input.", 4 CIN9 (in) "Capacitance Sensor Input.", 5 CIN10 (in) "Capacitance Sensor Input.", 6 CIN11 (in) "Capacitance Sensor Input.", 7 CIN12 (in) "Capacitance Sensor Input.", 8 ACSHIELD (out) "CDC Active Shield Output. Connect to external shield or plane.", 9 BIAS "Bias Node for Internal Circuitry. Requires 100 nF capacitor to ground.", 10 GND (power) "Ground Reference Point for All Circuitry.", 11 VCC (power) "Supply Voltage.", 12 VDRIVE (power) "Serial Interface Operating Voltage Supply.", 13 SDO (hiz) "SPI Serial Data Output.", 14 SDI (in) "SPI Serial Data Input.", 15 SCLK (in) "Clock Input for Serial Interface.", 16 ~{CS} (in) "SPI Chip Select Signal.", 17 ~{INT} (oc) "General-Purpose Open-Drain Interrupt Output. Programmable polarity; requires pull-up resistor.", 18 GPIO (io) "Programmable GPIO.", 19 CIN0 (in) "Capacitance Sensor Input.", 20 CIN1 (in) "Capacitance Sensor Input.", 21 CIN2 (in) "Capacitance Sensor Input.", 22 CIN3 (in) "Capacitance Sensor Input.", 23 CIN4 (in) "Capacitance Sensor Input.", 24 CIN5 (in) "Capacitance Sensor Input.", 25 EP (power) "Capacitance Sensor Input."